# Altium schematic symbol library LimeMicroAltiumLib_schLib_r05.SchLib: 582 symbols (part 11 of 13)
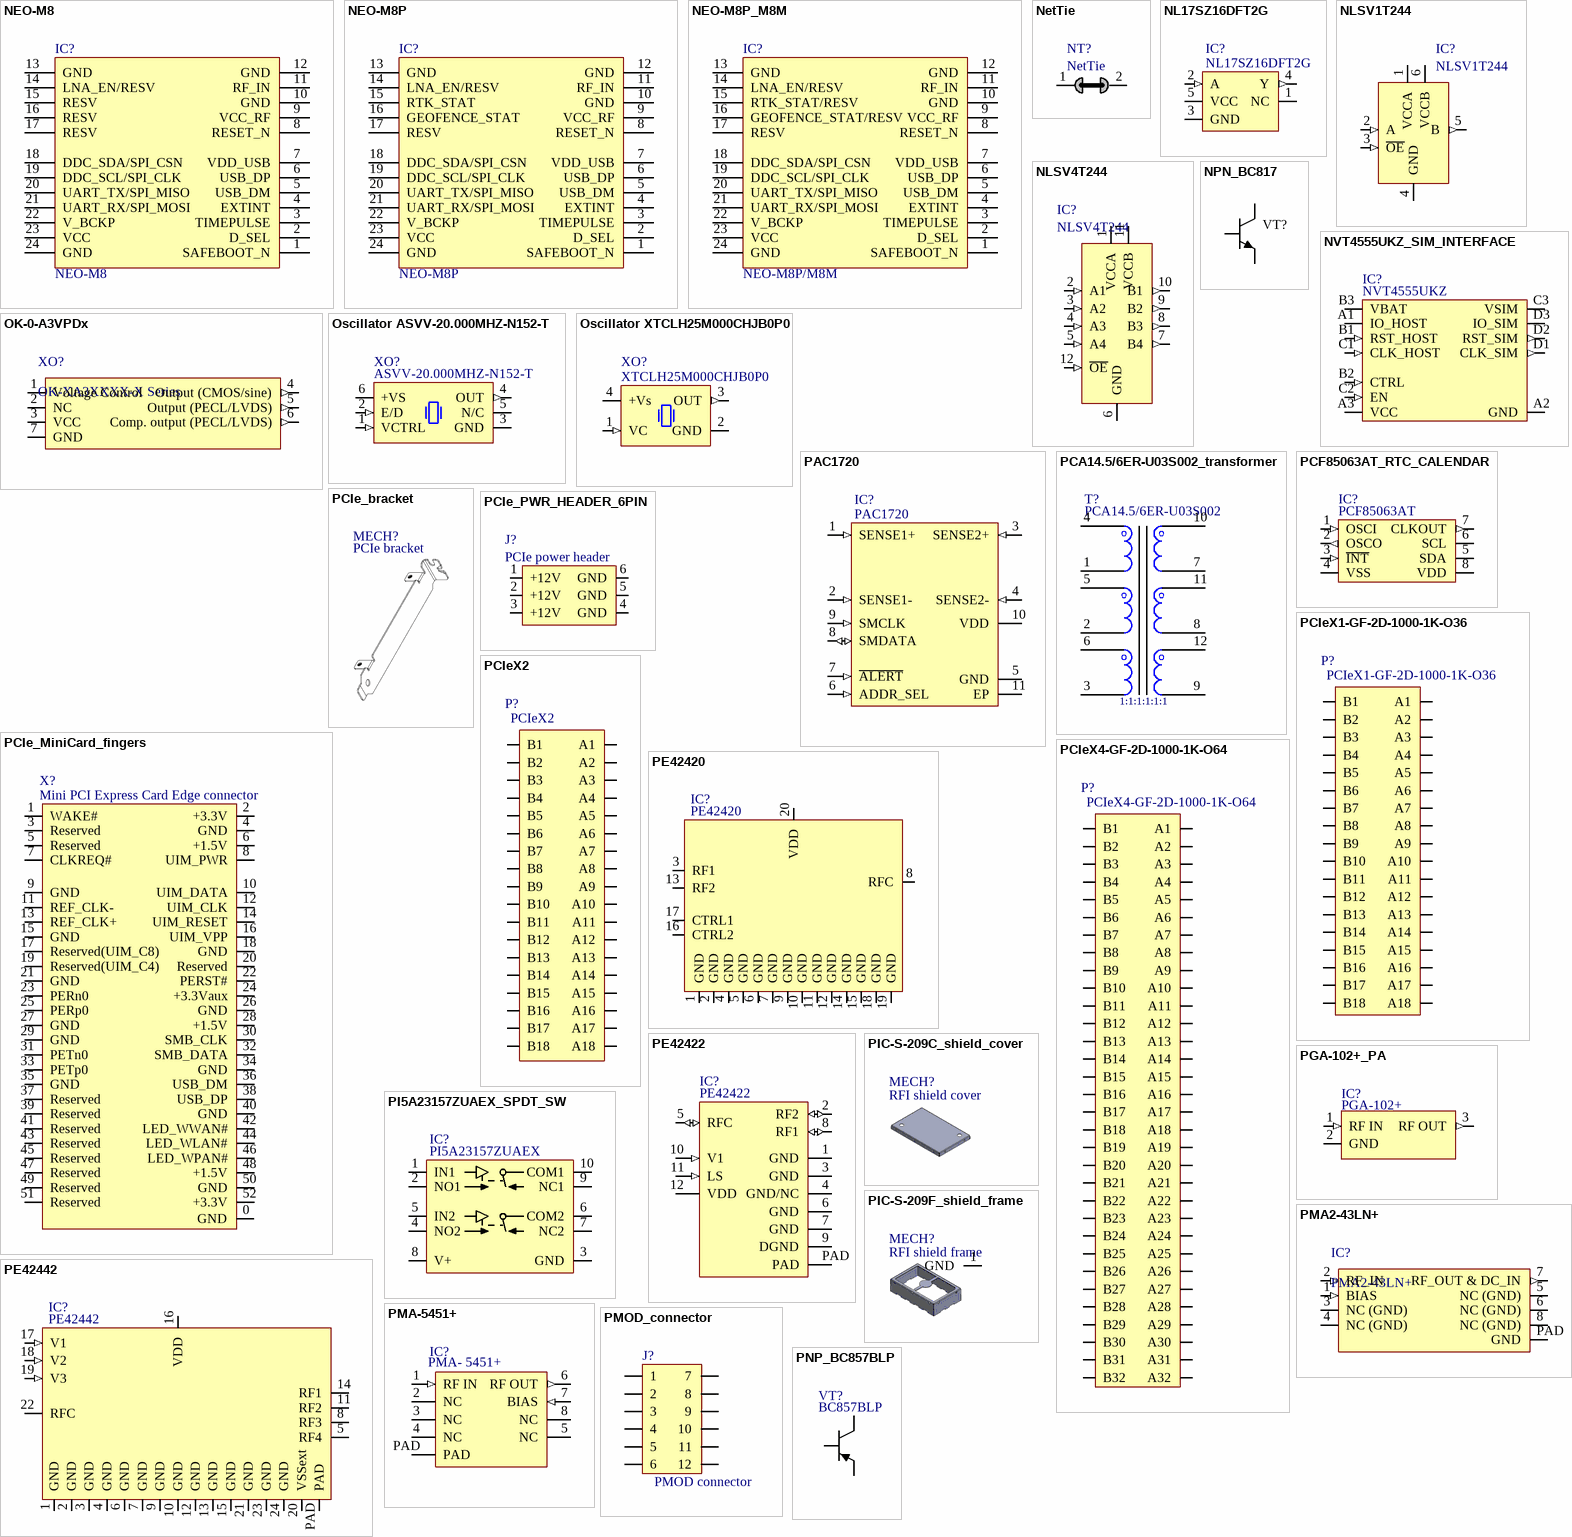
[diagram p84: symbols NEO-M8 to PNP_BC857BLP]

## NVT4555UKZ_SIM_INTERFACE
designator IC?, comment NVT4555UKZ
Part Description: SIM Card Interface 12-WLCSP (1.20x1.60); Manufacturer: NXP Semiconductors; Operating Supply Current: 5uA; Max Supply Voltage: 3.6V; Supplier 1: Digi-Key; Supplier Part Number 1: 568-11436-1-ND; Manufacturer Part Number 1: NVT4555UKZ; Stock 1: 2519; Pricing 1: 1=1,59000, 10=1,41900, 25=1,34720, 100=1,10660, 250=1,03440, 500=0,91410, 1000=0,76061 (USD); RoHS: Yes; Mount: Surface Mount; Number of Pins: 12; Weight: 0.002328oz; Min Operating Temperature: -40°C; Max Operating Temperature: 85°C; Packaging: Tape and Reel; Package Quantity: 3000; RoHS Compliant: Yes; ComponentLink1URL: http://www.mouser.com/ds/2/302/NVT4555-527699.pdf?src-supplier=Mouser; ComponentLink1Description: http://www.mouser.com/ds/2/302/NVT4555-527699.pdf?src-supplier=Mouser
footprint NVT4555UKZ_SIM_INTERFACE_WLCSP12 (Footprint not found)
pins: A1 IO_HOST (io), A2 GND, A3 VCC (power), B1 RST_HOST (in), B2 CTRL (in), B3 VBAT (power), C1 CLK_HOST (in), C2 EN (in), C3 VSIM (power), D1 CLK_SIM (out), D2 RST_SIM (out), D3 IO_SIM (io)

## OK-0-A3VPDx
designator XO?, comment OK-XA3XXXX-X Series
Manufacturer: NEL Frequency Control; Part Description: Up to 1.0 GHz  Ultra High Frequency Range Excellent Temperature Stability  CMOS PECL/LVPECL LVDS Sine  3.3V 5V; Supplier Part Number 1: *; Supplier 1: NEL Frequency Control
footprint OK-0-A3VPDx
pins: 1 Voltage Control, 2 NC, 3 VCC (power), 4 Output (CMOS/sine) (out), 5 Output (PECL/LVDS) (out), 6 Comp. output (PECL/LVDS) (out), 7 GND

## Oscillator ASVV-20.000MHZ-N152-T
designator XO?, comment ASVV-20.000MHZ-N152-T
Manufacturer: Abracon; Part Description: XTAL OSC VCXO 20.0000MHZ CMOS; Frequency: 20MHz; Load Capacitance: 30pF; Operating Supply Voltage: 3.3V; Max Supply Voltage: 3.465V; Min Supply Voltage: 3.135V; Max Supply Current: 15mA; Frequency Stability: 50ppm; Max Duty Cycle: 60%; Supplier 1: Digi-Key; Supplier Part Number 1: 535-9344-1-ND; Manufacturer Part Number 1: ASVV-20.000MHZ-N152-T; Stock 1: 1109; Pricing 1: 1=4,74000, 10=4,49300, 50=4,24320, 100=3,99360, 500=3,86880 (USD); RoHS: Yes; Mount: Surface Mount; Case/Package: SMD/SMT; Number of Pins: 6; Min Operating Temperature: 0°C; Max Operating Temperature: 70°C; Packaging: Tape and Reel; Package Quantity: 1000; Termination: SMD/SMT; Series: ASVV; Length: 0.276inch; Width: 0.197inch; Height: 0.079inch; Depth: 5mm; Radiation Hardening: No; Lead Free: Lead Free; RoHS Compliant: No; ComponentLink1URL: https://datasheet.ciiva.com/867/asvv-867044.pdf?src-supplier=Digi-Key; ComponentLink1Description: https://datasheet.ciiva.com/867/asvv-867044.pdf?src-supplier=Digi-Key; ComponentLink2URL: https://datasheet.ciiva.com/867/asvv-867045.pdf?src-supplier=Digi-Key; ComponentLink2Description: https://datasheet.ciiva.com/867/asvv-867045.pdf?src-supplier=Digi-Key; ComponentLink3URL: https://datasheet.ciiva.com/867/asvv-867046.pdf?src-supplier=Digi-Key; ComponentLink3Description: https://datasheet.ciiva.com/867/asvv-867046.pdf?src-supplier=Digi-Key
footprint XO_ASVV-20.000MHZ-N152-T
pins: 1 VCTRL (in), 2 E/D (in), 3 GND, 4 OUT (out), 5 N/C, 6 +VS (power)

## Oscillator XTCLH25M000CHJB0P0
designator XO?, comment XTCLH25M000CHJB0P0
Manufacturer: Murata; Part Description: XTAL OSC VCTCXO 25.0000MHZ CMOS; Supplier 1: Digi-Key; Supplier Part Number 1: 490-XTCLH25M000CHJB0P0CT-ND; Manufacturer Part Number 1: XTCLH25M000CHJB0P0; Stock 1: 1960; Pricing 1: 1=10,11000, 10=9,48000, 50=9,16400, 100=8,84800, 500=8,53200, 1000=7,90000 (USD)
footprint XO_XTCLH25M000CHJB0P0 (SMD Oscillator, Corner Convave, 4 pins, 5x3.2mm)
pins: 1 VC (in), 2 GND, 3 OUT (out), 4 +Vs (power)

## PAC1720
designator IC?
Part Description: Current Sense Regulator High-Side 10-DFN (3x3); Manufacturer Part Number 1: PAC1720-1-AIA-TR; Manufacturer: Microchip Technology; Voltage - Input: 0 V ~ 40 V; Sensing Method: High-Side; Function: Current Sense; Accuracy: ±1%; Supplier 1: Digi-Key; Category: Integrated Circuits (ICs); Supplier Device Package: 10-DFN (3x3); Packaging: Cut Tape (CT); Part Status: Active; Current - Output: -; Package / Case: 10-VFDFN Exposed Pad; Operating Temperature: -40°C ~ 85°C; Mounting Type: Surface Mount; RoHS: RoHS Compliant; Supplier Part Number 1: PAC1720-1-AIA-CT-ND
footprint PAC1720_VDFN (10-Lead Very Thin Plastic Dual Flat, No Lead Package (9Q) - 3x3 mm Body [VDFN])
pins: 1 SENSE1+ (in), 2 SENSE1- (in), 3 SENSE2+ (in), 4 SENSE2- (in), 5 GND, 6 ADDR_SEL (in), 7 ~{ALERT} (in), 8 SMDATA (io), 9 SMCLK (in), 10 VDD (power), 11 EP

## PCA14.5/6ER-U03S002_transformer
designator T?, comment PCA14.5/6ER-U03S002
Part Description: For  SMPS Transformer  Isolation  Surface Mount; Manufacturer: TDK Corporation; Supplier Part Number 1: 445-1678-1-ND; Manufacturer Part Number 1: PCA14.5/6ER-U03S002; Supplier 1: Digi-Key
pins: 1, 2, 3, 4, 5, 6, 7, 8, 9, 10, 11, 12
text: 1:1:1:1:1:1

## PCF85063AT_RTC_CALENDAR
designator IC?, comment PCF85063AT
Part Description: Real Time Clock (RTC) IC Clock/Calendar - I²C, 2-Wire Serial 8-SOIC (0.154", 3.90mm Width)
footprint PCF85063AT_RTC_SOIC-8
pins: 1 OSCI (in), 2 OSCO (out), 3 ~{INT} (in), 4 VSS, 5 SDA (io), 6 SCL (io), 7 CLKOUT (out), 8 VDD (power)

## PCIe_bracket
designator MECH?, comment PCIe bracket
Manufacturer: Keystone Electronics; Manufacturer Part Number 1: 9203; Part Description: BRACKET, COMPUTER, PCI,LENGTH 120mm, HOLE TO HOLE DISTANCE 85.4mm; Card Type: PCI; Style: Blank; Supplier 1: Digi-Key; RoHS: RoHS Compliant; Category: Computers, Office - Components, Accessories; Stock 1: 5093; Pricing 1: 1=3.31, 10=2.083, 50=1.87, 100=1.785, 250=1.615, 1000=1.44, 2500=1.28001, 5000=1.1305 (USD); Part Status: Active; Material: Steel, Nickel Plated; ComponentLink1URL: http://www.keyelco.com/product-pdf.cfm?p=2468; ComponentLink1Description: http://www.keyelco.com/product-pdf.cfm?p=2468; Supplier Part Number 1: 36-9203-ND
footprint PCIe_bracket

## PCIe_MiniCard_fingers
designator X?, comment Mini PCI Express Card Edge connector  (no BOM)
PCIe MiniCard full or half size
footprint PCIe_MiniCard (Footprint not found)
pins: 0 GND, 1 WAKE#, 2 +3.3V, 3 Reserved, 4 GND, 5 Reserved, 6 +1.5V, 7 CLKREQ#, 8 UIM_PWR, 9 GND, 10 UIM_DATA, 11 REF_CLK-, 12 UIM_CLK, 13 REF_CLK+, 14 UIM_RESET, 15 GND, 16 UIM_VPP, 17 Reserved(UIM_C8), 18 GND, 19 Reserved(UIM_C4), 20 Reserved, 21 GND, 22 PERST#, 23 PERn0, 24 +3.3Vaux, 25 PERp0, 26 GND, 27 GND, 28 +1.5V, 29 GND, 30 SMB_CLK, 31 PETn0, 32 SMB_DATA, 33 PETp0, 34 GND, 35 GND, 36 USB_DM, 37 Reserved, 38 USB_DP, 39 Reserved, 40 GND, 41 Reserved, 42 LED_WWAN#, 43 Reserved, 44 LED_WLAN#, 45 Reserved, 46 LED_WPAN#, 47 Reserved, 48 +1.5V, 49 Reserved, 50 GND, 51 Reserved, 52 +3.3V

## PCIe_PWR_HEADER_6PIN
designator J?, comment PCIe power header
Manufacturer Part Number 1: 0455580003; Manufacturer: Molex Connector Corporation; Number of Positions Loaded: All; Pitch: 0.165" (4.20mm); Number of Positions: 6; Connector Type: Header, Shrouded; Supplier 1: Digi-Key; Contact Finish: Tin; Contact Finish Thickness: 100µin (2.54µm); Fastening Type: Locking Ramp; RoHS: RoHS Compliant; Contact Type: Male Pin; Features: Board Lock; Color: Black; Packaging: Tray; Mounting Type: Through Hole, Right Angle; Category: Connectors, Interconnects; Contact Mating Length: -; Row Spacing: 0.165" (4.20mm); Termination: Solder; Number of Rows: 2; Supplier Part Number 1: WM10869-ND
footprint PCIe_POWER_HEADER_6PIN
pins: 1 +12V, 2 +12V, 3 +12V, 4 GND, 5 GND, 6 GND

## PCIeX1-GF-2D-1000-1K-O36
designator P?  (no BOM)
footprint PCIeX1-GF-2D-1000-1K-O36
pins: A1, A2, A3, A4, A5, A6, A7, A8, A9, A10, A11, A12, A13, A14, A15, A16, A17, A18, B1, B2, B3, B4, B5, B6, B7, B8, B9, B10, B11, B12, B13, B14, B15, B16, B17, B18

## PCIeX2
designator P?  (no BOM)
footprint PCIeX2
pins: A1, A2, A3, A4, A5, A6, A7, A8, A9, A10, A11, A12, A13, A14, A15, A16, A17, A18, B1, B2, B3, B4, B5, B6, B7, B8, B9, B10, B11, B12, B13, B14, B15, B16, B17, B18

## PCIeX4-GF-2D-1000-1K-O64
designator P?  (no BOM)
footprint PCIeX4-GF-2D-1000-1K-O64
pins: A1, A2, A3, A4, A5, A6, A7, A8, A9, A10, A11, A12, A13, A14, A15, A16, A17, A18, A19, A20, A21, A22, A23, A24, A25, A26, A27, A28, A29, A30, A31, A32, B1, B2, B3, B4, B5, B6, B7, B8, B9, B10, B11, B12, B13, B14, B15, B16, B17, B18, B19, B20, B21, B22, B23, B24, B25, B26, B27, B28, B29, B30, B31, B32

## PE42420
designator IC?
UltraCMOS SPDT RF Switch  100 – 6000 MHz; Manufacturer Part Number: PE42420LGBB-Z; Manufacturer: Peregrine Semiconductor; Topology: Absorptive; Impedance: 50 Ohm; Frequency - Upper: 6GHz; RF Type: General Purpose; Voltage - Supply: 2.7 V ~ 5.5 V; Frequency - Lower: 100MHz; Insertion Loss @ Frequency: 1.6dB @ 6GHz; Isolation @ Frequency: 50dB @ 6GHz (typ); P1dB: 33dBm (min) IP1dB; IIP3: 65dBm (typ); Supplier 1: Digi-Key; RoHS: RoHS Compliant; Category: RF/IF and RFID; Circuit: SPDT; Supplier Device Package: 20-LGA (4x4); Operating Temperature: -40°C ~ 85°C; Features: -; Packaging: Cut Tape (CT); Package / Case: 20-TFLGA Exposed Pad; Supplier Part Number 1: 1046-1069-1-ND
footprint PE42420_20QFN (QFN, 20-Leads, Body 4,00x4,00mm, Pitch 0,50mm, Thermal Pad 2,70x2,70mm, IPC Medium Density)
pins: 1 GND, 2 GND, 3 RF1 (io), 4 GND, 5 GND, 6 GND, 7 GND, 8 RFC (io), 9 GND, 10 GND, 11 GND, 12 GND, 13 RF2 (io), 14 GND, 15 GND, 16 CTRL2 (in), 17 CTRL1 (in), 18 GND, 19 GND, 20 VDD (power)

## PE42422
designator IC?
Manufacturer: Peregrine Semiconductor; Manufacturer Part Number 1: PE42422MLAA-Z; Part Description: IC RF SWITCH SPDT 50 OHM 12QFN; Frequency - Lower: 100MHz; Isolation @ Frequency: 17dB @ 6GHz (typ); Insertion Loss @ Frequency: 0.9dB @ 6GHz; IIP3: 70dBm (typ); Topology: Reflective; Circuit: SPDT; Impedance: 50 Ohm; Voltage - Supply: 2.3 V ~ 5.5 V; RF Type: General Purpose; Supplier 1: Digi-Key; RoHS: RoHS Compliant; Category: RF/IF and RFID; Stock 1: 21993; Pricing 1: 1=1.32, 101=0.92 (USD); Packaging: Cut Tape (CT); Part Status: Active; P1dB: -; Features: -; Operating Temperature: -40°C ~ 85°C; Package / Case: 12-UFQFN Exposed Pad; Supplier Device Package: 12-QFN (2x2); ComponentLink1URL: http://www.psemi.com/pdf/datasheets/pe42422ds.pdf; ComponentLink1Description: http://www.psemi.com/pdf/datasheets/pe42422ds.pdf; Supplier Part Number 1: 1046-1062-1-ND
footprint PE42422_QFN12 (Footprint not found)
pins: 1 GND, 2 RF2 (io), 3 GND, 4 GND/NC, 5 RFC (io), 6 GND, 7 GND, 8 RF1 (io), 9 DGND, 10 V1 (in), 11 LS (in), 12 VDD (power), PAD

## PE42442
designator IC?
UltraCMOS SPDT RF Switch  100 – 6000 MHz; Manufacturer Part Number 1: PE42442A-Z; Manufacturer: Peregrine Semiconductor; Topology: Absorptive; Insertion Loss @ Frequency: 1.1dB @ 900MHz; IIP3: 58dBm (typ); Isolation @ Frequency: 61dB @ 900MHz (typ); RF Type: 3G/4G; Voltage - Supply: 3.3V; Impedance: 50 Ohm; Circuit: SP4T; Frequency - Lower: 30MHz; Frequency - Upper: 6GHz; Supplier 1: Digi-Key; Supplier Device Package: 24-QFN (4x4); Package / Case: 24-WFQFN Exposed Pad; Operating Temperature: -40°C ~ 105°C; Features: -; P1dB: -; Category: RF/IF and RFID; Packaging: Cut Tape (CT); RoHS: RoHS Compliant; Supplier Part Number 1: 1046-1096-1-ND
footprint PE42442_24QFN (QFN, 24-Leads, Body 4,00x4,00mm, Pitch 0,50mm, thermal pad, IPC Medium Density)
pins: 1 GND, 2 GND, 3 GND, 4 GND, 5 RF4 (io), 6 GND, 7 GND, 8 RF3 (io), 9 GND, 10 GND, 11 RF2 (io), 12 GND, 13 GND, 14 RF1 (io), 15 GND, 16 VDD (power), 17 V1 (in), 18 V2 (in), 19 V3 (in), 20 VSSext, 21 GND, 22 RFC (io), 23 GND, 24 GND, PAD

## PGA-102+_PA
designator IC?, comment PGA-102+
Part Description: *
pins: 1 RF IN (in), 2 GND, 3 RF OUT (out)

## PI5A23157ZUAEX_SPDT_SW
designator IC?, comment PI5A23157ZUAEX
Manufacturer: Diodes; Part Description: 2 Circuit IC Switch 2:1 15Ohm 10-UQFN (1.5x2); Supplier 1: Digi-Key; Supplier Part Number 1: 31-PI5A23157ZUAEXCT-ND; Manufacturer Part Number 1: PI5A23157ZUAEX; Stock 1: 2985; Pricing 1: 1=0,87000, 10=0,77000, 25=0,72280, 100=0,59000, 250=0,54800, 500=0,46640, 1000=0,37312 (USD); RoHS: No
footprint PI5A23157ZUAEX_SPDT_SW_10UQFN
pins: 1 IN1, 2 NO1, 3 GND, 4 NO2, 5 IN2, 6 COM2, 7 NC2, 8 V+, 9 NC1, 10 COM1

## PIC-S-209C_shield_cover
designator MECH?, comment RFI shield cover  (mechanical)
Part Description: RF Shield Cover 0.728" (18.50mm) X 1.156" (29.36mm) Vent Holes in Pattern Snap Fit; Manufacturer Part Number: PIC-S-209C; Manufacturer: 3G Shielding Specialties LP; Supplier Part Number 1: 2276-PIC-S-209C-ND; Supplier 1: Digi-Key

## PIC-S-209F_shield_frame
designator MECH?, comment RFI shield frame
Part Description: RF Shield Frame 0.728" (18.50mm) X 1.156" (29.36mm) - Solder; Manufacturer Part Number: PIC-S-209F; Manufacturer: 3G Shielding Specialties LP; Supplier Part Number 1: 2276-PIC-S-209FTR-ND; Supplier 1: Digi-Key
footprint SHIELD_PIC-S-209F_v2
pins: 1 GND

## PMA2-43LN+
designator IC?
Part Description: Monolithic Amplifier, 1.1 to 4.0 GHz, 50R, , 2 x 2 x 1mm; Manufacturer: Mini-Circuits; Supplier 1: Mini-Circuits; Supplier Part Number 1: PMA2-43LN+; Manufacturer Part Number 1: PMA2-43LN+
footprint PMA2-43LN+_QFN8_2x2mm
pins: 1 BIAS (in), 2 RF_IN (in), 3 NC (GND), 4 NC (GND), 5 NC (GND), 6 NC (GND), 7 RF_OUT & DC_IN (out), 8 NC (GND), PAD GND

## PMA-5451+
designator IC?, comment PMA- 5451+
Part Description: Wideband, up to 6 GHz; Ultra Low Noise Figure, 0.6 dB; High IP3/Low Current, 30mA Monolithic Amplifier. 3x3mm MCLP; Manufacturer: Mini-Circuits; Manufacturer Part Number 1: PMA-5451+; Supplier Part Number 1: PMA-5451+; Supplier 1: Mini-Circuits
footprint PMA-5451+_MCLP8
pins: 1 RF IN (in), 2 NC, 3 NC, 4 NC, 5 NC, 6 RF OUT (out), 7 BIAS (in), 8 NC, PAD

## PMOD_connector
designator J?, comment PMOD connector
Header, 4-Pin, Dual row; Manufacturer Part Number: PPPC062LJBN-RC; Manufacturer: Sullins Connector Solutions; Row Spacing: 0.100" (2.54mm); Number of Positions Loaded: All; Number of Positions: 12; Supplier 1: Digi-Key; Mounting Type: Through Hole, Right Angle; Contact Finish: Gold; Features: -; Category: Connectors, Interconnects; Packaging: Bulk; RoHS: RoHS Compliant; Number of Rows: 2; Contact Finish Thickness: Flash; Pitch: 0.100" (2.54mm); Termination: Solder; Contact Type: Female Socket; Color: Black; Connector Type: Header; Fastening Type: -; Supplier Part Number 1: S5559-ND
footprint PMODconn_right_angle_TH (JTAG)
pins: 1, 2, 3, 4, 5, 6, 7, 8, 9, 10, 11, 12

## PNP_BC857BLP
designator VT?, comment BC857BLP
Manufacturer: Diodes Incorporated; Manufacturer Part Number 1: BC857BLP-7B; Part Description: Bipolar (BJT) Transistor PNP 45V 100mA 100MHz 250mW Surface Mount 3-DFN1006 (1.0x0.6); Transistor Type: PNP; Current - Collector (Ic) (Max): 100mA; Voltage - Collector Emitter Breakdown (Max): 45V; Vce Saturation (Max) @ Ib, Ic: 650mV @ 5mA, 100mA; Current - Collector Cutoff (Max): 15nA (ICBO); DC Current Gain (hFE) (Min) @ Ic, Vce: 220 @ 2mA, 5V; Power - Max: 250mW; Frequency - Transition: 100MHz; Supplier 1: Digi-Key; RoHS: RoHS Compliant; Category: Discrete Semiconductor Products; Stock 1: 16398; Pricing 1: 1=0.39, 10=0.32, 100=0.2175, 500=0.16316, 1000=0.12236 (USD); Packaging: Cut Tape (CT); Part Status: Active; Operating Temperature: -55°C ~ 150°C (TJ); Mounting Type: Surface Mount; Package / Case: 3-UFDFN; Supplier Device Package: 3-DFN1006 (1.0x0.6); ComponentLink1URL: https://www.diodes.com/assets/Datasheets/ds30526.pdf; ComponentLink1Description: https://www.diodes.com/assets/Datasheets/ds30526.pdf; Supplier Part Number 1: BC857BLP-7BDICT-ND
footprint BC857BLP
pins: B, C, E

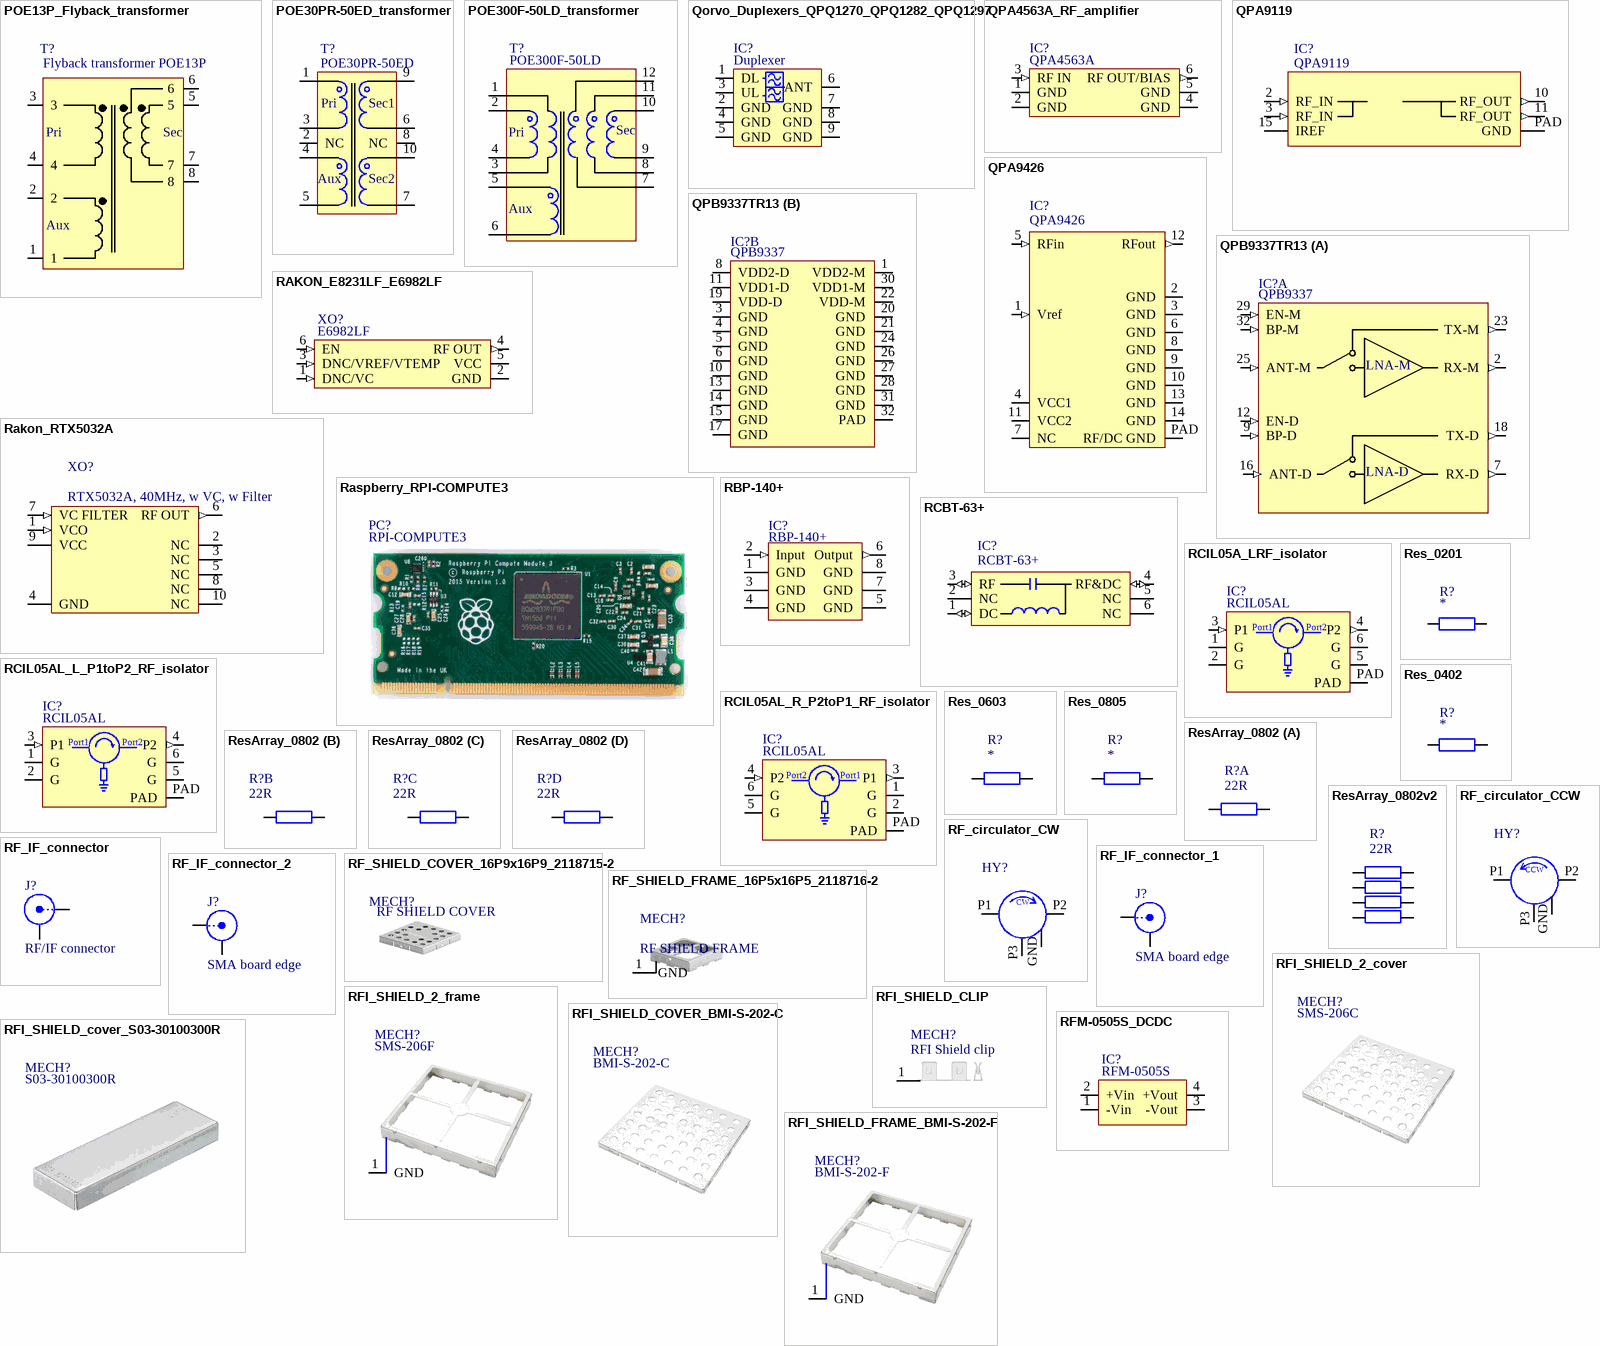
[diagram p61: symbols POE13P_Flyback_transformer to RFM-0505S_DCDC]

## POE13P_Flyback_transformer
designator T?, comment Flyback transformer POE13P
Part Description: Audio Transformers / Signal Transformers POE13P Flyback PoE 127uH 5.0 V 2.6 A; Manufacturer: Coilcraft; Manufacturer Part Number 1: POE13P-50LB; Turns Ratio: 1:0.25; Inductance: 127uh; DC Resistance (DCR): 222mR; Isolation Voltage: 1.5kV; Supplier 1: Mouser; Stock 1: 99; Pricing 1: 1=3.92, 10=3.53, 50=3.14, 100=2.75, 1000=2.11, 10000=2.11 (USD); Case/Package: 127; Packaging: Cut Tape; Package Quantity: 1; Length: 13.46mm; Height: 12.7mm; Width: 13mm; Lead Free: Contains Lead; REACH SVHC: No SVHC; Supplier Part Number 1: 994-POE13P-50LB
footprint PoE13P-50L_Flyback_transformer
pins: 1, 2, 3, 4, 5, 6, 7, 8
text: Pri; Sec; Aux

## POE30PR-50ED_transformer
designator T?, comment POE30PR-50ED
Part Description: Audio Transformers / Signal Transformers Flyback PoE 30W 48uH 5V 3.6A; Manufacturer: Coilcraft; Supplier 1: Mouser; Supplier Part Number 1: 994-POE30PR-50ED; Manufacturer Part Number 1: POE30PR-50ED; Stock 1: 0; Pricing 1: 1=5,14000, 10=4,63000, 50=4,11000, 100=3,60000, 1000=2,77000, 10000=2,77000 (USD); RoHS: Yes
footprint POE30PR50ED_TRANSFORMER
pins: 1, 2 NC, 3, 4, 5, 6, 7, 8 NC, 9, 10
text: Pri; Sec1; Aux; Sec2

## POE300F-50LD_transformer
designator T?, comment POE300F-50LD
Part Description: Audio Transformers / Signal Transformers POE300F Flyback PoE+ 30uH 5.0 V 6 A; Manufacturer: Coilcraft; Supplier 1: Mouser; Supplier Part Number 1: 994-POE300F-50LD; Manufacturer Part Number 1: POE300F-50LD; Stock 1: 160; Pricing 1: 1=6,63000, 10=5,98000, 50=5,31000, 100=4,65000, 1000=3,57000, 10000=3,57000 (USD); RoHS: Yes; Packaging: Tape and Reel; Package Quantity: 175; Length: 21mm; Width: 20.57mm; Height: 11.43mm; Lead Free: Contains Lead; RoHS Compliant: Yes; ComponentLink1URL: http://www.mouser.com/ds/2/597/poe300-463486.pdf?src-supplier=Mouser; ComponentLink1Description: http://www.mouser.com/ds/2/597/poe300-463486.pdf?src-supplier=Mouser
footprint POE300F50LD_TRANSFORMER
pins: 1, 2, 3, 4, 5, 6, 7, 8, 9, 10, 11, 12
text: Sec; Pri; Aux

## Qorvo_Duplexers_QPQ1270_QPQ1282_QPQ1297
designator IC?, comment Duplexer
Manufacturer: Qorvo; Supplier 1: Qorvo; Manufacturer Part Number 1: *; Supplier Part Number 1: *
footprint Qorvo_QPQ_duplexer (QPQ1270, QPQ1282, QPQ1297 BAW duplexers)
pins: 1 DL (io), 2 GND, 3 UL (io), 4 GND, 5 GND, 6 ANT (io), 7 GND, 8 GND, 9 GND
